# Altium footprint library con-molex.PCBLIB: 368 footprints (part 3 of 26)
Each footprint in its own frame and in the unit in brackets; x right, y up, seen from the top. Pads: shape width x height; smd on the part's side, far side on the other; paste and mask are expansions set on the pad; w line width, h text height; cw(c..) or ccw(c..) is an arc to the next point about the centre after c.
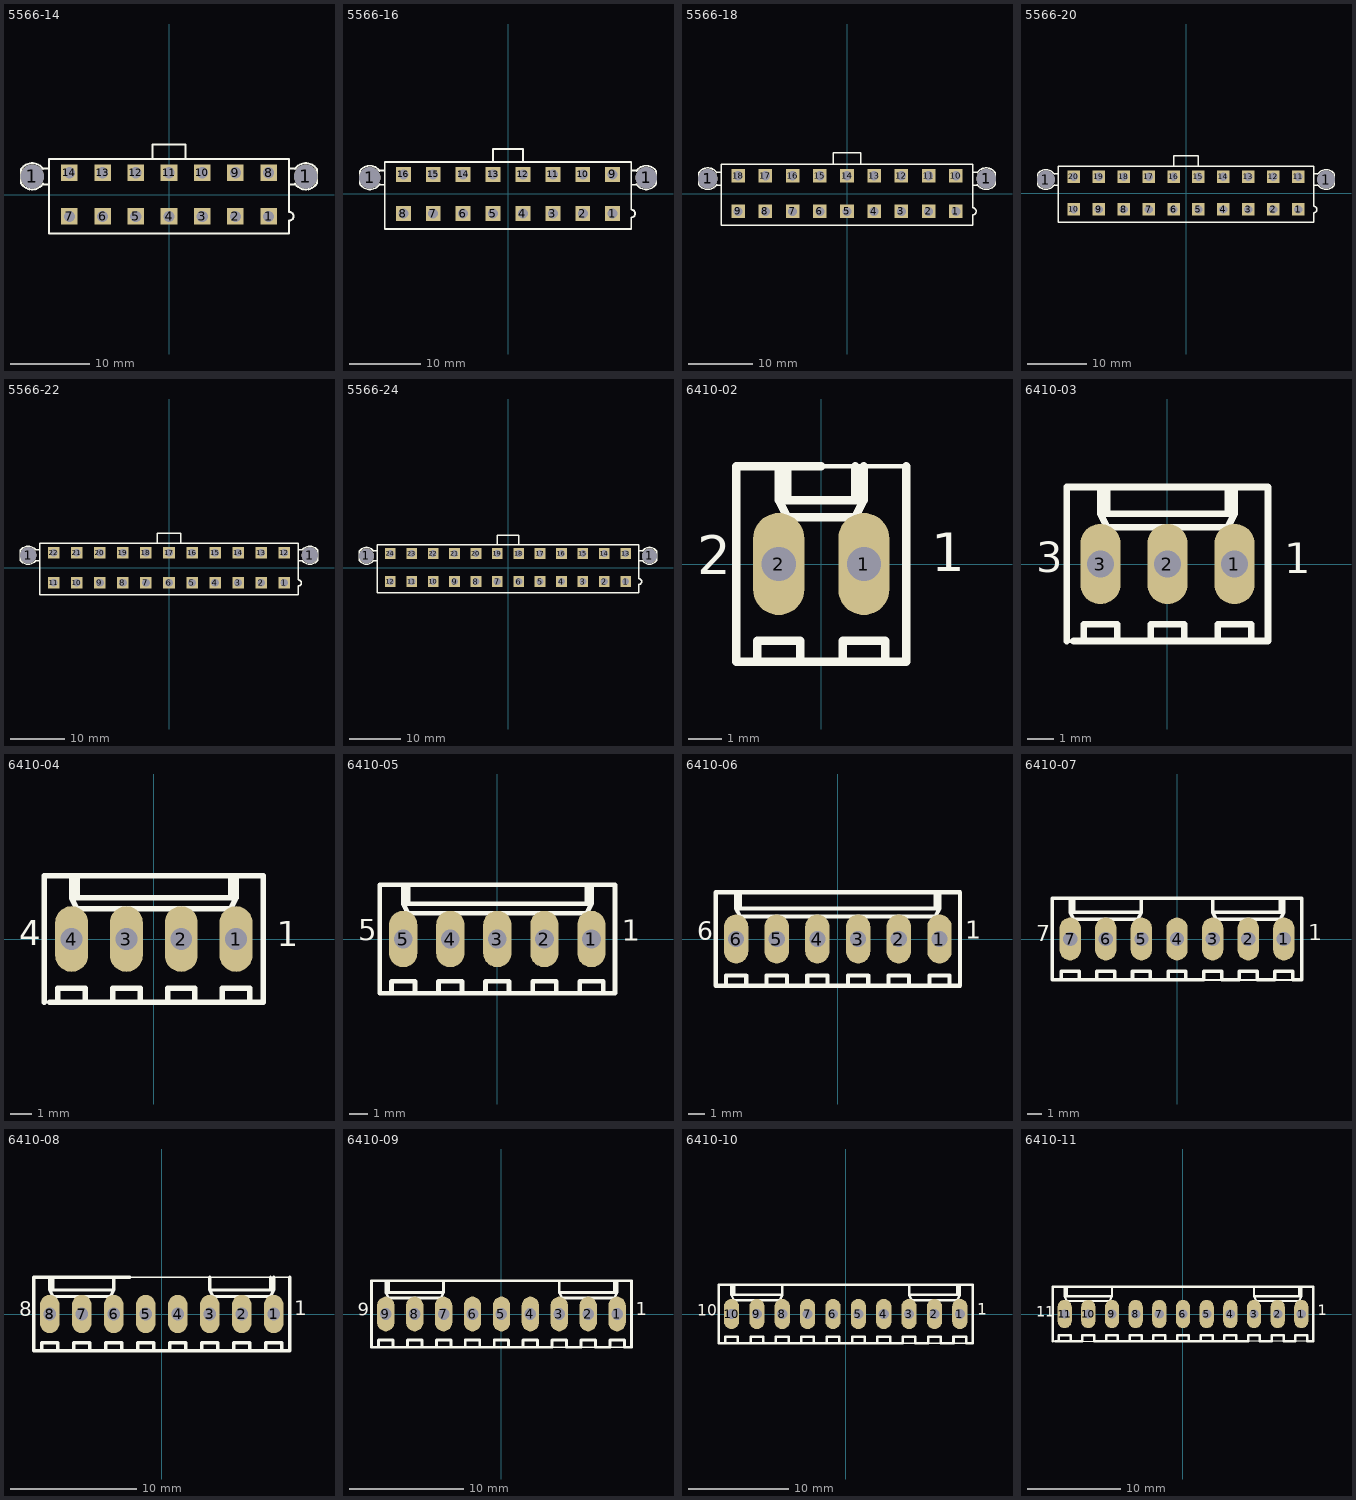
[diagram p2: the footprints below, top view; thin cyan lines are the x and y axes]

## 5566-14 [mm]
pads (16):
  round 3 hole 3: 1(-17.3,2.29) 1(17.3,2.29)
  rect 2.1x2.1 hole 1.4: 1(12.6,-2.75) 2(8.4,-2.75) 3(4.2,-2.75) 4(0,-2.75) 5(-4.2,-2.75) 6(-8.4,-2.75) 7(-12.6,-2.75) 8(12.6,2.75) 9(8.4,2.75) 10(4.2,2.75) 11(0,2.75) 12(-4.2,2.75) 13(-8.4,2.75) 14(-12.6,2.75)
Top Overlay:
  lines w0.254: -16,1.3 -15.3,1.3 ; -16,3.3 -15.3,3.3 ; -15.9,1.4 cw(c-17.3,2.3) -18.7,1.4 -18.7,3.2 cw(c-17.3,2.3) -15.9,3.2 ; -2.1,4.6 -2.1,6.3 2.1,6.3 2.1,4.6 ; 15.3,1.3 16,1.3 ; 15.3,3.3 16,3.3 ; 15.9,1.4 ccw(c17.3,2.3) 18.7,1.4 18.7,3.2 ccw(c17.3,2.3) 15.9,3.2 ; -15.2,-4.9 15.2,-4.9 15.2,-3.3 ccw(c15.2,-2.75) 15.2,-2.2 15.2,4.5 -15.2,4.5 -15.2,-4.9

## 5566-16 [mm]
pads (18):
  round 3 hole 3: 1(-19.4,2.29) 1(19.4,2.29)
  rect 2.1x2.1 hole 1.4: 1(14.7,-2.75) 2(10.5,-2.75) 3(6.3,-2.75) 4(2.1,-2.75) 5(-2.1,-2.75) 6(-6.3,-2.75) 7(-10.5,-2.75) 8(-14.7,-2.75) 9(14.7,2.75) 10(10.5,2.75) 11(6.3,2.75) 12(2.1,2.75) 13(-2.1,2.75) 14(-6.3,2.75) 15(-10.5,2.75) 16(-14.7,2.75)
Top Overlay:
  lines w0.254: -18.1,1.3 -17.4,1.3 ; -18.1,3.3 -17.4,3.3 ; -18,1.4 cw(c-19.4,2.3) -20.8,1.4 -20.8,3.2 cw(c-19.4,2.3) -18,3.2 ; -2.1,4.6 -2.1,6.3 2.1,6.3 2.1,4.6 ; 17.4,1.3 18.1,1.3 ; 17.4,3.3 18.1,3.3 ; 18,1.4 ccw(c19.4,2.3) 20.8,1.4 20.8,3.2 ccw(c19.4,2.3) 18,3.2 ; -17.3,-4.9 17.3,-4.9 17.3,-3.3 ccw(c17.3,-2.75) 17.3,-2.2 17.3,4.5 -17.3,4.5 -17.3,-4.9

## 5566-18 [mm]
pads (20):
  round 3 hole 3: 1(-21.5,2.29) 1(21.5,2.29)
  rect 2.1x2.1 hole 1.4: 1(16.8,-2.75) 2(12.6,-2.75) 3(8.4,-2.75) 4(4.2,-2.75) 5(0,-2.75) 6(-4.2,-2.75) 7(-8.4,-2.75) 8(-12.6,-2.75) 9(-16.8,-2.75) 10(16.8,2.75) 11(12.6,2.75) 12(8.4,2.75) 13(4.2,2.75) 14(0,2.75) 15(-4.2,2.75) 16(-8.4,2.75) 17(-12.6,2.75) 18(-16.8,2.75)
Top Overlay:
  lines w0.254: -20.2,1.3 -19.5,1.3 ; -20.2,3.3 -19.5,3.3 ; -20.1,1.4 cw(c-21.5,2.3) -22.9,1.4 -22.9,3.2 cw(c-21.5,2.3) -20.1,3.2 ; -2.1,4.6 -2.1,6.3 2.1,6.3 2.1,4.6 ; 19.5,1.3 20.2,1.3 ; 19.5,3.3 20.2,3.3 ; 20.1,1.4 ccw(c21.5,2.3) 22.9,1.4 22.9,3.2 ccw(c21.5,2.3) 20.1,3.2 ; -19.4,-4.9 19.4,-4.9 19.4,-3.3 ccw(c19.4,-2.75) 19.4,-2.2 19.4,4.5 -19.4,4.5 -19.4,-4.9

## 5566-20 [mm]
pads (22):
  round 3 hole 3: 1(-23.6,2.29) 1(23.6,2.29)
  rect 2.1x2.1 hole 1.4: 1(18.9,-2.75) 2(14.7,-2.75) 3(10.5,-2.75) 4(6.3,-2.75) 5(2.1,-2.75) 6(-2.1,-2.75) 7(-6.3,-2.75) 8(-10.5,-2.75) 9(-14.7,-2.75) 10(-18.9,-2.75) 11(18.9,2.75) 12(14.7,2.75) 13(10.5,2.75) 14(6.3,2.75) 15(2.1,2.75) 16(-2.1,2.75) 17(-6.3,2.75) 18(-10.5,2.75) 19(-14.7,2.75) 20(-18.9,2.75)
Top Overlay:
  lines w0.254: -22.3,1.3 -21.6,1.3 ; -22.3,3.3 -21.6,3.3 ; -22.2,1.4 cw(c-23.6,2.3) -25,1.4 -25,3.2 cw(c-23.6,2.3) -22.2,3.2 ; -2.1,4.6 -2.1,6.3 2.1,6.3 2.1,4.6 ; 21.6,1.3 22.3,1.3 ; 21.6,3.3 22.3,3.3 ; 22.2,1.4 ccw(c23.6,2.3) 25,1.4 25,3.2 ccw(c23.6,2.3) 22.2,3.2 ; -21.5,-4.9 21.5,-4.9 21.5,-3.3 ccw(c21.5,-2.75) 21.5,-2.2 21.5,4.5 -21.5,4.5 -21.5,-4.9

## 5566-22 [mm]
pads (24):
  round 3 hole 3: 1(-25.7,2.29) 1(25.7,2.29)
  rect 2.1x2.1 hole 1.4: 1(21,-2.75) 2(16.8,-2.75) 3(12.6,-2.75) 4(8.4,-2.75) 5(4.2,-2.75) 6(0,-2.75) 7(-4.2,-2.75) 8(-8.4,-2.75) 9(-12.6,-2.75) 10(-16.8,-2.75) 11(-21,-2.75) 12(21,2.75) 13(16.8,2.75) 14(12.6,2.75) 15(8.4,2.75) 16(4.2,2.75) 17(0,2.75) 18(-4.2,2.75) 19(-8.4,2.75) 20(-12.6,2.75) 21(-16.8,2.75) 22(-21,2.75)
Top Overlay:
  lines w0.254: -24.4,1.3 -23.7,1.3 ; -24.4,3.3 -23.7,3.3 ; -24.3,1.4 cw(c-25.7,2.3) -27.1,1.4 -27.1,3.2 cw(c-25.7,2.3) -24.3,3.2 ; -2.1,4.6 -2.1,6.3 2.1,6.3 2.1,4.6 ; 23.7,1.3 24.4,1.3 ; 23.7,3.3 24.4,3.3 ; 24.3,1.4 ccw(c25.7,2.3) 27.1,1.4 27.1,3.2 ccw(c25.7,2.3) 24.3,3.2 ; -23.6,-4.9 23.6,-4.9 23.6,-3.3 ccw(c23.6,-2.75) 23.6,-2.2 23.6,4.5 -23.6,4.5 -23.6,-4.9

## 5566-24 [mm]
pads (26):
  round 3 hole 3: 1(-27.8,2.29) 1(27.8,2.29)
  rect 2.1x2.1 hole 1.4: 1(23.1,-2.75) 2(18.9,-2.75) 3(14.7,-2.75) 4(10.5,-2.75) 5(6.3,-2.75) 6(2.1,-2.75) 7(-2.1,-2.75) 8(-6.3,-2.75) 9(-10.5,-2.75) 10(-14.7,-2.75) 11(-18.9,-2.75) 12(-23.1,-2.75) 13(23.1,2.75) 14(18.9,2.75) 15(14.7,2.75) 16(10.5,2.75) 17(6.3,2.75) 18(2.1,2.75) 19(-2.1,2.75) 20(-6.3,2.75) 21(-10.5,2.75) 22(-14.7,2.75) 23(-18.9,2.75) 24(-23.1,2.75)
Top Overlay:
  lines w0.254: -26.5,1.3 -25.8,1.3 ; -26.5,3.3 -25.8,3.3 ; -26.4,1.4 cw(c-27.8,2.3) -29.2,1.4 -29.2,3.2 cw(c-27.8,2.3) -26.4,3.2 ; -2.1,4.6 -2.1,6.3 2.1,6.3 2.1,4.6 ; 25.8,1.3 26.5,1.3 ; 25.8,3.3 26.5,3.3 ; 26.4,1.4 ccw(c27.8,2.3) 29.2,1.4 29.2,3.2 ccw(c27.8,2.3) 26.4,3.2 ; -25.7,-4.9 25.7,-4.9 25.7,-3.3 ccw(c25.7,-2.75) 25.7,-2.2 25.7,4.5 -25.7,4.5 -25.7,-4.9

## 6410-02 [mil]
pads (2):
  oval 60x120 hole 40: 1(50,0) 2(-50,0)
Top Overlay:
  lines w5: -90,-115 -75,-115 ; -50,100 -50,115 -40,115 ; 0,-115 25,-115 ; 0,115 100,115 ; 75,-115 100,-115
  lines w10: -40,115 -40,75 ; 0,-115 -100,-115 ; 0,115 -50,115 ; 40,115 40,75 ; 50,115 50,75 ; 100,115 100,0 100,-115 75,-115 ; -100,-115 -100,0 -100,115 -50,115 ; -100,-115 -75,-115 -75,-90 -25,-90 -25,-115 25,-115 ; -50,75 -50,115 ; -50,75 -40,75 ; -50,75 -40,55 40,55 50,75 ; -40,75 40,75 ; 25,-115 75,-115 ; 25,-115 25,-90 75,-90 75,-115 ; 40,75 50,75
  text "1" at 128.94,-24.06 h77.5
  text "2" at -146.06,-27.06 h77.5
Mechanical 16:
  rectangle: -60,-10 -40,10
  rectangle: 40,-10 60,10

## 6410-03 [mil]
pads (3):
  oval 60x120 hole 40: 1(100,0) 2(0,0) 3(-100,0)
Top Overlay:
  lines w5: -150,-115 -50,-115 -25,-115 ; -100,100 -100,115 -90,115
  lines w10: -150,-115 -150,0 -150,115 -100,115 ; -140,-115 -125,-115 ; -90,115 -90,75 ; 90,115 90,75 ; 100,115 100,75 ; -125,-115 -125,-90 -75,-90 -75,-115 ; -125,-115 -75,-115 ; -100,75 -100,115 ; -100,75 -90,75 ; -100,75 -90,55 90,55 100,75 ; -100,115 -50,115 150,115 150,0 150,-115 125,-115 ; -90,75 90,75 ; -75,-115 -25,-115 ; -25,-115 25,-115 ; -25,-115 -25,-90 25,-90 25,-115 ; 25,-115 75,-115 ; 75,-115 125,-115 ; 75,-115 75,-90 125,-90 125,-115 ; 90,75 100,75
  text "1" at 173.94,-29.06 h77.5
  text "3" at -196.06,-27.06 h77.5
Mechanical 16:
  rectangle: -110,-10 -90,10
  rectangle: -10,-10 10,10
  rectangle: 90,-10 110,10

## 6410-04 [mil]
pads (4):
  oval 60x120 hole 40: 1(150,0) 2(50,0) 3(-50,0) 4(-150,0)
Top Overlay:
  lines w5: -200,-115 -105,-115 ; -150,100 -150,115 -140,115
  lines w10: -200,-115 -200,0 -200,115 -150,115 ; -190,-115 -175,-115 ; -140,115 -140,75 ; -105,-115 200,-115 ; 140,115 140,75 ; 150,115 150,75 ; -175,-115 -175,-90 -125,-90 -125,-115 -75,-115 -75,-90 -25,-90 -25,-115 ; -175,-115 -25,-115 ; -150,75 -150,115 ; -150,75 -140,75 ; -150,75 -140,55 140,55 150,75 ; -150,115 -100,115 200,115 200,0 200,-115 ; -140,75 140,75 ; -25,-115 25,-115 25,-90 75,-90 75,-115 125,-115 125,-90 175,-90 175,-115 200,-115 ; 140,75 150,75
  text "1" at 223.94,-29.06 h77.5
  text "4" at -246.06,-27.06 h77.5
Mechanical 16:
  rectangle: -160,-10 -140,10
  rectangle: -60,-10 -40,10
  rectangle: 40,-10 60,10
  rectangle: 140,-10 160,10

## 6410-05 [mil]
pads (5):
  oval 60x120 hole 40: 1(200,0) 2(100,0) 3(0,0) 4(-100,0) 5(-200,0)
Top Overlay:
  lines w5: -200,100 -200,115
  lines w10: -240,-115 -225,-115 -225,-90 -175,-90 -175,-115 -125,-115 -125,-90 -75,-90 -75,-115 -25,-115 ; 50,-115 -250,-115 -250,0 -250,115 -200,115 ; 190,115 190,75 ; 200,115 200,75 ; -200,75 -200,115 ; -200,75 -190,75 ; -200,75 -190,55 190,55 200,75 ; -200,115 -190,115 ; -190,75 190,75 ; -190,75 -190,115 ; -190,115 50,115 250,115 250,0 250,-115 225,-115 ; -25,-115 -25,-90 25,-90 25,-115 ; -25,-115 25,-115 ; 25,-115 75,-115 ; 75,-115 125,-115 ; 75,-115 75,-90 125,-90 125,-115 ; 125,-115 175,-115 ; 175,-115 225,-115 ; 175,-115 175,-90 225,-90 225,-115 ; 190,75 200,75
  text "1" at 263.94,-19.06 h77.5
  text "5" at -296.06,-17.06 h77.5
Mechanical 16:
  rectangle: -10,-10 10,10
  rectangle: 90,-10 110,10
  rectangle: 190,-10 210,10
  rectangle: -110,-10 -90,10
  rectangle: -210,-10 -190,10

## 6410-06 [mil]
pads (6):
  oval 60x120 hole 40: 1(250,0) 2(150,0) 3(50,0) 4(-50,0) 5(-150,0) 6(-250,0)
Top Overlay:
  lines w5: -250,100 -250,115
  lines w10: -290,-115 -275,-115 -275,-90 -225,-90 -225,-115 -175,-115 -175,-90 -125,-90 -125,-115 -75,-115 -75,-90 -25,-90 -25,-115 25,-115 25,-90 75,-90 75,-115 125,-115 125,-90 175,-90 175,-115 225,-115 225,-90 275,-90 275,-115 300,-115 ; 240,115 240,75 ; 250,115 250,75 ; -250,75 -250,115 ; -250,75 -240,75 ; -250,75 -240,55 240,55 250,75 ; -250,115 -300,115 -300,0 -300,-115 -5,-115 300,-115 ; -250,115 -240,115 ; -240,75 240,75 ; -240,75 -240,115 ; -240,115 0,115 300,115 300,0 300,-115 ; 240,75 250,75
  text "1" at 313.94,-14.06 h77.5
  text "6" at -346.06,-17.06 h77.5
Mechanical 16:
  rectangle: -260,-10 -240,10
  rectangle: -160,-10 -140,10
  rectangle: -60,-10 -40,10
  rectangle: 40,-10 60,10
  rectangle: 140,-10 160,10
  rectangle: 240,-10 260,10

## 6410-07 [mil]
pads (7):
  oval 60x120 hole 40: 1(300,0) 2(200,0) 3(100,0) 4(0,0) 5(-100,0) 6(-200,0) 7(-300,0)
Top Overlay:
  lines w5: -300,100 -300,115 ; -55,-115 350,-115
  lines w10: -340,-115 -325,-115 -325,-90 -275,-90 -275,-115 -225,-115 -225,-90 -175,-90 -175,-115 -125,-115 -125,-90 -75,-90 -75,-115 75,-115 75,-90 125,-90 125,-115 175,-115 175,-90 225,-90 225,-115 275,-115 275,-90 325,-90 325,-115 350,-115 350,0 350,115 -50,115 -100,115 ; -55,-115 -350,-115 -350,0 -350,115 -300,115 ; -25,-115 -25,-90 25,-90 25,-115 ; 100,115 100,75 ; 290,115 290,75 ; 300,115 300,75 ; -300,75 -300,115 ; -300,75 -290,75 ; -300,75 -290,55 -110,55 -100,75 ; -300,115 -290,115 ; -290,75 -100,75 ; -290,75 -290,115 ; -290,115 -100,115 ; -100,75 -100,115 ; 100,75 290,75 ; 100,75 110,55 290,55 300,75 ; 290,75 300,75
  text "1" at 368.94,-19.06 h77.5
  text "7" at -396.06,-22.06 h77.5
Mechanical 16:
  rectangle: 90,-10 110,10
  rectangle: 190,-10 210,10
  rectangle: 290,-10 310,10
  rectangle: -10,-10 10,10
  rectangle: -110,-10 -90,10
  rectangle: -310,-10 -290,10
  rectangle: -210,-10 -190,10

## 6410-08 [mil]
pads (8):
  oval 60x120 hole 40: 1(350,0) 2(250,0) 3(150,0) 4(50,0) 5(-50,0) 6(-150,0) 7(-250,0) 8(-350,0)
Top Overlay:
  lines w5: -350,100 -350,115 ; -100,115 400,115
  lines w10: -390,-115 -375,-115 -375,-90 -325,-90 -325,-115 -275,-115 -275,-90 -225,-90 -225,-115 -175,-115 -175,-90 -125,-90 -125,-115 125,-115 125,-90 175,-90 175,-115 225,-115 225,-90 275,-90 275,-115 325,-115 325,-90 375,-90 375,-115 400,-115 ; -100,115 -150,115 ; -75,-115 -75,-90 -25,-90 -25,-115 ; 25,-115 25,-90 75,-90 75,-115 ; 150,115 150,75 ; 340,115 340,75 ; 350,115 350,75 ; 400,115 400,0 400,-115 ; -350,75 -350,115 ; -350,75 -340,75 ; -350,75 -340,55 -160,55 -150,75 ; -350,115 -400,115 -400,0 -400,-115 -105,-115 400,-115 ; -350,115 -340,115 ; -340,75 -150,75 ; -340,75 -340,115 ; -340,115 -150,115 ; -150,75 -150,115 ; 150,75 340,75 ; 150,75 160,55 340,55 350,75 ; 340,75 350,75
  text "1" at 413.94,-19.06 h77.5
  text "8" at -446.06,-22.06 h77.5
Mechanical 16:
  rectangle: -360,-10 -340,10
  rectangle: -260,-10 -240,10
  rectangle: -160,-10 -140,10
  rectangle: 140,-10 160,10
  rectangle: 240,-10 260,10
  rectangle: 340,-10 360,10
  rectangle: -60,-10 -40,10
  rectangle: 40,-10 60,10

## 6410-09 [mil]
pads (9):
  oval 60x120 hole 40: 1(400,0) 2(300,0) 3(200,0) 4(100,0) 5(0,0) 6(-100,0) 7(-200,0) 8(-300,0) 9(-400,0)
Top Overlay:
  lines w5: -400,100 -400,115 ; -155,-115 450,-115
  lines w10: -440,-115 -425,-115 -425,-90 -375,-90 -375,-115 -325,-115 -325,-90 -275,-90 -275,-115 -225,-115 -225,-90 -175,-90 -175,-115 175,-115 175,-90 225,-90 225,-115 275,-115 275,-90 325,-90 325,-115 375,-115 375,-90 425,-90 425,-115 450,-115 450,0 450,115 -150,115 -200,115 ; -155,-115 -450,-115 -450,0 -450,115 -400,115 ; -125,-115 -125,-90 -75,-90 -75,-115 ; -25,-115 -25,-90 25,-90 25,-115 ; 75,-115 75,-90 125,-90 125,-115 ; 200,115 200,75 ; 390,115 390,75 ; 400,115 400,75 ; -400,75 -400,115 ; -400,75 -390,75 ; -400,75 -390,55 -210,55 -200,75 ; -400,115 -390,115 ; -390,75 -200,75 ; -390,75 -390,115 ; -390,115 -200,115 ; -200,75 -200,115 ; 200,75 390,75 ; 200,75 210,55 390,55 400,75 ; 390,75 400,75
  text "1" at 463.94,-19.06 h77.5
  text "9" at -496.06,-22.06 h77.5
Mechanical 16:
  rectangle: 190,-10 210,10
  rectangle: 290,-10 310,10
  rectangle: 390,-10 410,10
  rectangle: -410,-10 -390,10
  rectangle: 90,-10 110,10
  rectangle: -10,-10 10,10
  rectangle: -310,-10 -290,10
  rectangle: -210,-10 -190,10
  rectangle: -110,-10 -90,10

## 6410-10 [mil]
pads (10):
  oval 60x120 hole 40: 1(450,0) 2(350,0) 3(250,0) 4(150,0) 5(50,0) 6(-50,0) 7(-150,0) 8(-250,0) 9(-350,0) 10(-450,0)
Top Overlay:
  lines w5: -450,100 -450,115 ; -205,-115 500,-115
  lines w10: -490,-115 -475,-115 -475,-90 -425,-90 -425,-115 -375,-115 -375,-90 -325,-90 -325,-115 -275,-115 -275,-90 -225,-90 -225,-115 225,-115 225,-90 275,-90 275,-115 325,-115 325,-90 375,-90 375,-115 425,-115 425,-90 475,-90 475,-115 500,-115 500,0 500,115 -200,115 -250,115 ; -205,-115 -500,-115 -500,0 -500,115 -450,115 ; -175,-115 -175,-90 -125,-90 -125,-115 ; -75,-115 -75,-90 -25,-90 -25,-115 ; 25,-115 25,-90 75,-90 75,-115 ; 125,-115 125,-90 175,-90 175,-115 ; 250,115 250,75 ; 440,115 440,75 ; 450,115 450,75 ; -450,75 -450,115 ; -450,75 -440,75 ; -450,75 -440,55 -260,55 -250,75 ; -450,115 -440,115 ; -440,75 -250,75 ; -440,75 -440,115 ; -440,115 -250,115 ; -250,75 -250,115 ; 250,75 440,75 ; 250,75 260,55 440,55 450,75 ; 440,75 450,75
  text "1" at 518.94,-19.06 h77.5
  text "10" at -586.06,-22.06 h77.5
Mechanical 16:
  rectangle: -460,-10 -440,10
  rectangle: -360,-10 -340,10
  rectangle: -260,-10 -240,10
  rectangle: 240,-10 260,10
  rectangle: 340,-10 360,10
  rectangle: 440,-10 460,10
  rectangle: -160,-10 -140,10
  rectangle: 140,-10 160,10
  rectangle: 40,-10 60,10
  rectangle: -60,-10 -40,10

## 6410-11 [mil]
pads (11):
  oval 60x120 hole 40: 1(500,0) 2(400,0) 3(300,0) 4(200,0) 5(100,0) 6(0,0) 7(-100,0) 8(-200,0) 9(-300,0) 10(-400,0) 11(-500,0)
Top Overlay:
  lines w5: -550,-115 -355,-115 550,-115 ; -500,100 -500,115
  lines w10: -550,-115 -550,0 -550,115 -500,115 ; -540,-115 -525,-115 ; -325,-115 -325,-90 -275,-90 -275,-115 ; -225,-115 -225,-90 -175,-90 -175,-115 ; -125,-115 -125,-90 -75,-90 -75,-115 ; -25,-115 -25,-90 25,-90 25,-115 ; 75,-115 75,-90 125,-90 125,-115 ; 175,-115 175,-90 225,-90 225,-115 ; 300,115 300,75 ; 490,115 490,75 ; 500,115 500,75 ; -525,-115 -475,-115 ; -525,-115 -525,-90 -475,-90 -475,-115 ; -500,75 -500,115 ; -500,75 -490,75 ; -500,75 -490,55 -310,55 -300,75 ; -500,115 -490,115 ; -490,75 -300,75 ; -490,75 -490,115 ; -490,115 -300,115 ; -475,-115 -425,-115 -425,-90 -375,-90 -375,-115 275,-115 275,-90 325,-90 325,-115 375,-115 375,-90 425,-90 425,-115 475,-115 475,-90 525,-90 525,-115 550,-115 550,0 550,115 -250,115 -300,115 ; -300,75 -300,115 ; 300,75 490,75 ; 300,75 310,55 490,55 500,75 ; 490,75 500,75
  text "1" at 568.94,-19.06 h77.5
  text "11" at -621.06,-27.06 h77.5
Mechanical 16:
  rectangle: -510,-10 -490,10
  rectangle: -410,-10 -390,10
  rectangle: 290,-10 310,10
  rectangle: 390,-10 410,10
  rectangle: 490,-10 510,10
  rectangle: -310,-10 -290,10
  rectangle: 190,-10 210,10
  rectangle: 90,-10 110,10
  rectangle: -210,-10 -190,10
  rectangle: -110,-10 -90,10
  rectangle: -10,-10 10,10